# Altium footprint library OpenBMS.PcbLib: 26 footprints (part 1 of 2)
Each footprint in its own frame and in the unit in brackets; x right, y up, seen from the top. Pads: shape width x height; smd on the part's side, far side on the other; paste and mask are expansions set on the pad; w line width, h text height; cw(c..) or ccw(c..) is an arc to the next point about the centre after c.
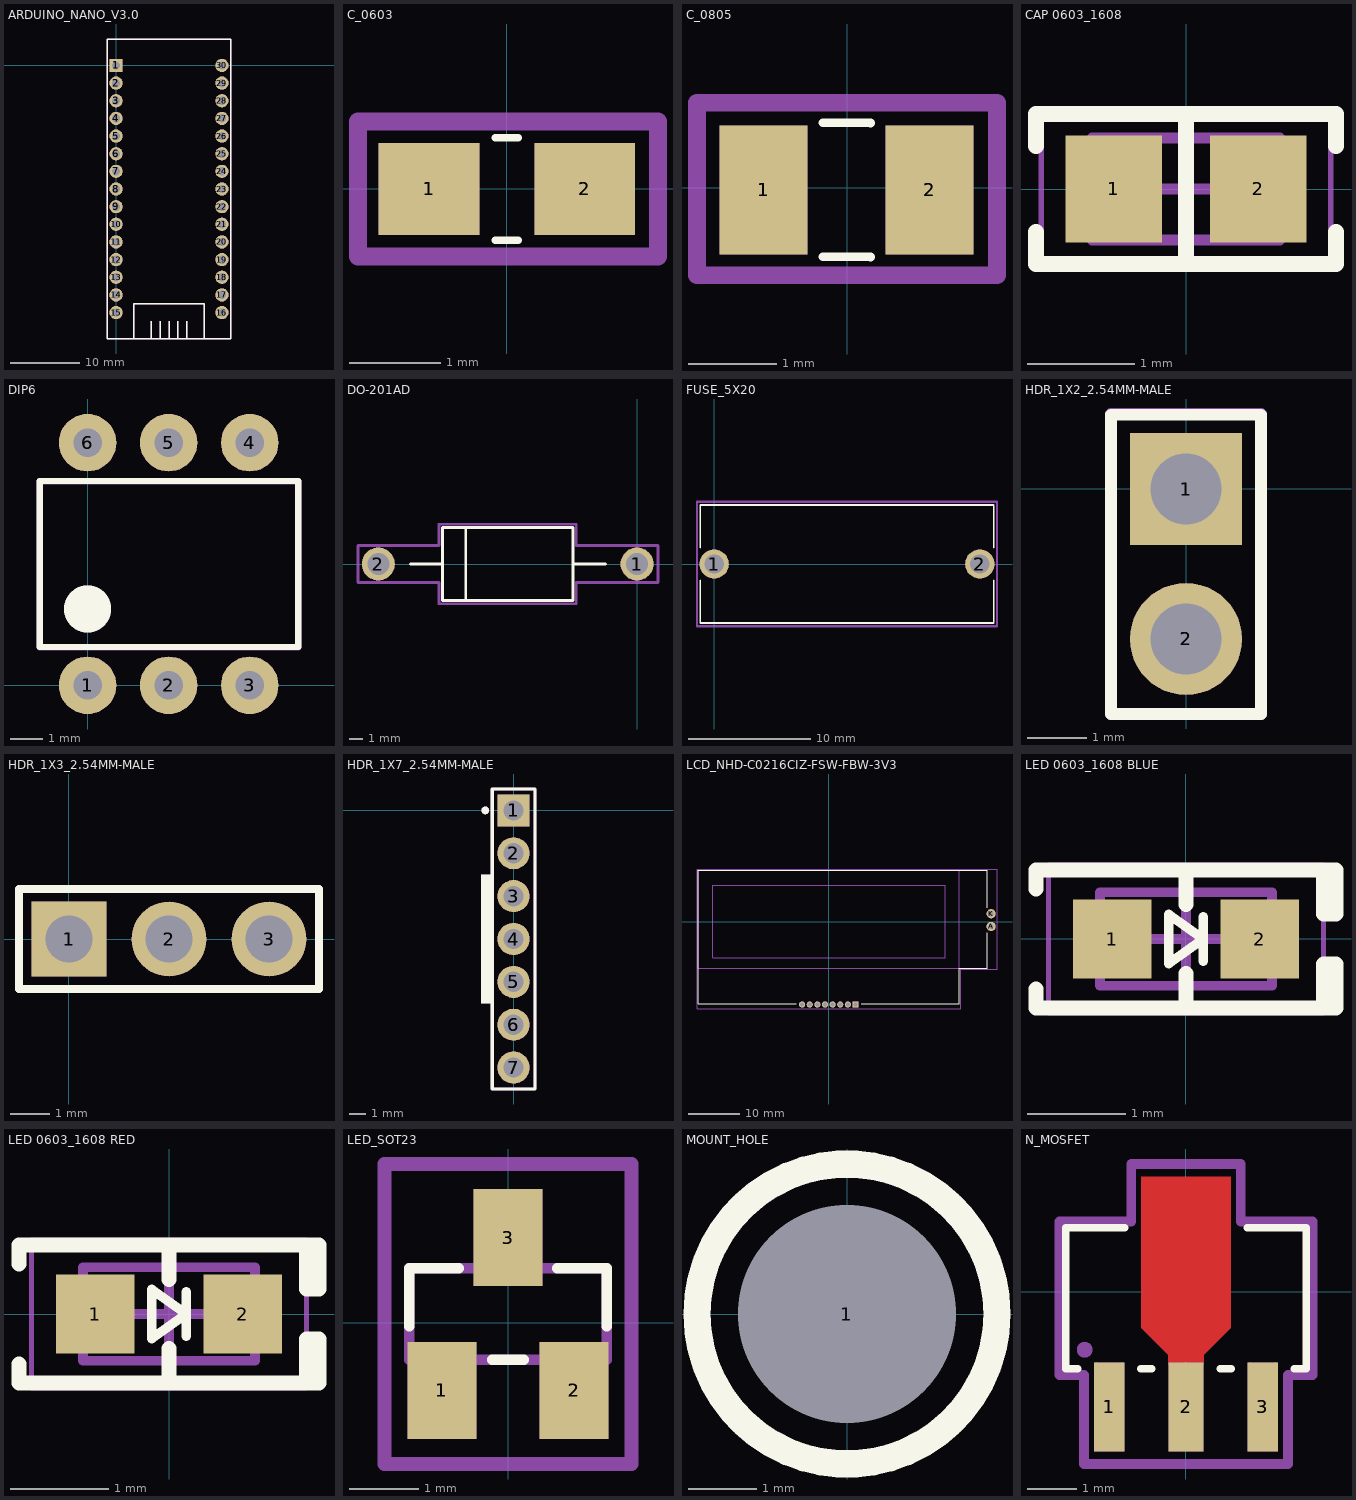
[diagram p0: the footprints below, top view; thin cyan lines are the x and y axes]

## ARDUINO_NANO_V3.0 [mm]
pads (60):
  rect 1.9x1.9 hole 1.2: 1(0,0)
  rect 1.9x1.9 on Mech15: 1(0,0)
  round 1.9 hole 1.2: 2(0,-2.54) 3(0,-5.08) 4(0,-7.62) 5(0,-10.16) 6(0,-12.7) 7(0,-15.24) 8(0,-17.78) 9(0,-20.32) 10(0,-22.86) 11(0,-25.4) 12(0,-27.94) 13(0,-30.48) 14(0,-33.02) 15(0,-35.56) 16(15.24,-35.56) 17(15.24,-33.02) 18(15.24,-30.48) 19(15.24,-27.94) 20(15.24,-25.4) 21(15.24,-22.86) 22(15.24,-20.32) 23(15.24,-17.78) 24(15.24,-15.24) 25(15.24,-12.7) 26(15.24,-10.16) 27(15.24,-7.62) 28(15.24,-5.08) 29(15.24,-2.54) 30(15.24,0)
  round 1.9 on Mech15: 2(0,-2.54) 3(0,-5.08) 4(0,-7.62) 5(0,-10.16) 6(0,-12.7) 7(0,-15.24) 8(0,-17.78) 9(0,-20.32) 10(0,-22.86) 11(0,-25.4) 12(0,-27.94) 13(0,-30.48) 14(0,-33.02) 15(0,-35.56) 16(15.24,-35.56) 17(15.24,-33.02) 18(15.24,-30.48) 19(15.24,-27.94) 20(15.24,-25.4) 21(15.24,-22.86) 22(15.24,-20.32) 23(15.24,-17.78) 24(15.24,-15.24) 25(15.24,-12.7) 26(15.24,-10.16) 27(15.24,-7.62) 28(15.24,-5.08) 29(15.24,-2.54) 30(15.24,0)
Top Overlay:
  lines w0.2: 5.08,-36.83 5.08,-39.37 ; 6.35,-36.83 6.35,-39.37 ; 7.62,-36.83 7.62,-39.37 ; 8.89,-36.83 8.89,-39.37 ; 10.16,-36.83 10.16,-39.37 ; 5.08,-39.37 -1.27,-39.37 -1.27,3.81 16.51,3.81 16.51,-39.37 12.7,-39.37 ; 5.08,-39.37 6.35,-39.37 ; 5.08,-39.37 6.35,-39.37 ; 5.08,-39.37 2.54,-39.37 2.54,-34.29 12.7,-34.29 12.7,-39.37 ; 6.35,-39.37 7.62,-39.37 ; 6.35,-39.37 7.62,-39.37 ; 7.62,-39.37 8.89,-39.37 ; 7.62,-39.37 8.89,-39.37 ; 8.89,-39.37 10.16,-39.37 ; 8.89,-39.37 10.16,-39.37 ; 10.16,-39.37 12.7,-39.37 ; 10.16,-39.37 12.7,-39.37
Mechanical 15:
  lines w0.2: 5.08,-36.83 5.08,-39.37 ; 6.35,-36.83 6.35,-39.37 ; 7.62,-36.83 7.62,-39.37 ; 8.89,-36.83 8.89,-39.37 ; 10.16,-36.83 10.16,-39.37 ; 5.08,-39.37 2.54,-39.37 2.54,-34.29 12.7,-34.29 12.7,-39.37 ; 5.08,-39.37 6.35,-39.37 ; 5.08,-39.37 6.35,-39.37 ; 6.35,-39.37 7.62,-39.37 ; 6.35,-39.37 7.62,-39.37 ; 7.62,-39.37 8.89,-39.37 ; 7.62,-39.37 8.89,-39.37 ; 8.89,-39.37 10.16,-39.37 ; 8.89,-39.37 10.16,-39.37 ; 10.16,-39.37 12.7,-39.37 ; 10.16,-39.37 12.7,-39.37 ; -1.27,-39.37 16.51,-39.37 16.51,3.81 -1.27,3.81 -1.27,-39.37
3D body "User Library-Nano-1.STEP": height 12.72, standoff -5.84, extent -1.275,-41.11 16.515,3.81

## C_0603 [mm]
pads (4):
  rect 1.1x1 smd: 1(-0.85,0) 2(0.85,0)
  rect 1.1x1 on Mech15: 1(-0.85,0) 2(0.85,0)
Top Overlay:
  lines w0.08: -0.127,-0.559 0.123,-0.559 ; -0.127,0.559 0.123,0.559
Mechanical 15:
  lines w0.2: -1.626,-0.737 -1.626,0.737 1.651,0.737 1.651,-0.737 -1.626,-0.737
3D body "GRT188R61H105KE13D.STEP": height 0.89, standoff -0.01, extent -0.8,-0.4 0.8,0.4

## C_0805 [mm]
pads (4):
  rect 1x1.47 smd: 1(-0.95,-0.025) 2(0.939,-0.025)
  rect 1x1.47 on Mech15: 1(-0.95,-0.025) 2(0.939,-0.025)
Top Overlay:
  lines w0.1: -0.275,-0.787 0.265,-0.79 ; -0.275,0.739 0.265,0.737
Mechanical 15:
  lines w0.2: -1.709,-0.998 1.707,-0.998 1.707,0.968 -1.709,0.968 -1.709,-0.998
3D body "GRM21BR71C105KA01K.STEP": height 1.44, standoff -0.01, extent -1.025,-0.65 0.975,0.6

## CAP 0603_1608 [mm] "Chip Capacitor, 2-Leads, Body 1.60x0.80mm, IPC Medium Density"
height 0.89
pads (2):
  rect 0.9x1 smd: 1(-0.675,0) 2(0.675,0)
Top Overlay:
  lines w0.15: -1.4,-0.4 -1.4,-0.7 1.4,-0.7 1.4,-0.4 ; -1.4,0.4 -1.4,0.7 1.4,0.7 1.4,0.4 ; 0,-0.7 0,0.7
Mechanical 13:
  lines w0.1: -0.875,-0.475 -0.875,0.475 0.875,0.475 0.875,-0.475 -0.875,-0.475
Mechanical 15:
  lines w0.05: -1.35,-0.75 -1.35,0.75 1.35,0.75 1.35,-0.75 -1.35,-0.75
  lines w0.1: -0.475,0 0.475,0 ; 0,-0.475 0,0.475
3D body "0603 cap.STEP": height 0.82, standoff 0, extent -0.8,-0.412 0.8,0.412

## DIP6 [mm]
pads (12):
  round 1.8 hole 0.9: 1(0,0) 2(2.54,0) 3(5.08,0) 4(5.08,7.6) 5(2.54,7.6) 6(0,7.6)
  round 1.8 on Mech15: 1(0,0) 2(2.54,0) 3(5.08,0) 4(5.08,7.6) 5(2.54,7.6) 6(0,7.6)
Top Overlay:
  circle w1.27: c0,2.393 r0.102
  lines w0.2: -1.5,1.2 -1.5,6.4 6.6,6.4 6.6,1.2 -1.5,1.2
Mechanical 15:
  circle w1.27: c0,2.388 r0.102
  lines w0.2: -1.5,1.195 6.6,1.195 6.6,6.395 -1.5,6.395 -1.5,1.195
3D body "User Library-DIP6.STEP": height 4.35, standoff -2.95, extent -1.016,-0.15 6.104,7.72

## DO-201AD [mm]
pads (4):
  round 2.4 hole 1.6: 1(0,0) 2(-18.84,0)
  round 2.4 on Mech15: 1(0,0) 2(-18.84,0)
Top Overlay:
  lines w0.2: -16.5,0 -14.22,0 ; -12.468,-2.65 -12.468,2.65 ; -4.62,0 -2.3,0 ; -14.17,-2.65 -4.67,-2.65 -4.67,2.65 -14.17,2.65 -14.17,-2.65
Mechanical 15:
  lines w0.127: -16.5,0 -14.22,0 ; -12.468,-2.65 -12.468,2.65 ; -4.62,0 -2.3,0 ; -14.17,-2.65 -14.17,2.65 -4.67,2.65 -4.67,-2.65 -14.17,-2.65
  lines w0.2: -20.32,-1.35 -20.32,1.35 -14.42,1.35 -14.42,2.9 -4.42,2.9 -4.42,1.35 1.524,1.35 1.524,-1.35 -4.42,-1.35 -4.42,-2.9 -14.42,-2.9 -14.42,-1.35 -20.32,-1.35
3D body "User Library-DO-201ADDO-27.step": height 5.63, standoff -3.99, extent -19.504,-2.82 0.636,2.82

## FUSE_5X20 [mm]
pads (4):
  round 2.4 hole 1.6: 1(0,0) 2(21.84,0)
  round 2.4 on Mech15: 1(0,0) 2(21.84,0)
Top Overlay:
  lines w0.127: -1.16,-1.32 -1.16,-4.85 23,-4.85 23,-1.32 ; -1.16,1.32 -1.16,4.85 23,4.85 23,1.32
Mechanical 15:
  lines w0.2: -1.41,-5.1 -1.41,5.1 23.25,5.1 23.25,-5.1 -1.41,-5.1
3D body "4527--3DModel-STEP-56544.STEP": height 10.81, standoff -4.15, extent -1.158,-4.851 22.998,4.851

## HDR_1X2_2.54MM-MALE [mm]
pads (4):
  rect 1.9x1.9 hole 1.2: 1(0,0)
  rect 1.9x1.9 on Mech15: 1(0,0)
  round 1.9 hole 1.2: 2(0,-2.54)
  round 1.9 on Mech15: 2(0,-2.54)
Top Overlay:
  lines w0.2: -1.27,-3.81 1.27,-3.81 1.27,1.257 -1.27,1.257 -1.27,-3.81
Mechanical 15:
  lines w0.2: -1.27,-3.81 1.27,-3.81 1.27,1.27 -1.27,1.27 -1.27,-3.81
3D body "pin_header_aw140-eg-g02a.stp": height 8.63, standoff -3.77, extent -1.253,-3.71 1.246,1.37

## HDR_1X3_2.54MM-MALE [mm] "Connector; Header; 3 Position"
pads (6):
  rect 1.9x1.9 hole 1.2: 1(0,0)
  rect 1.9x1.9 on Mech15: 1(0,0)
  round 1.9 hole 1.2: 2(2.54,0) 3(5.08,0)
  round 1.9 on Mech15: 2(2.54,0) 3(5.08,0)
Top Overlay:
  lines w0.2: -1.27,-1.27 -1.27,1.27 6.35,1.27 6.35,-1.27 -1.27,-1.27
Mechanical 15:
  lines w0.2: -1.27,-1.27 6.35,-1.27 6.35,1.27 -1.27,1.27 -1.27,-1.27
3D body "User Library-1x3 TH Pitch 2_54mm.STEP": height 9.21, standoff -3.49, extent -1.27,-1.27 6.35,1.27

## HDR_1X7_2.54MM-MALE [mm]
pads (14):
  rect 1.9x1.9 hole 1.2: 1(0,0)
  rect 1.9x1.9 on Mech15: 1(0,0)
  round 1.9 hole 1.2: 2(0,-2.54) 3(0,-5.08) 4(0,-7.62) 5(0,-10.16) 6(0,-12.7) 7(0,-15.24)
  round 1.9 on Mech15: 2(0,-2.54) 3(0,-5.08) 4(0,-7.62) 5(0,-10.16) 6(0,-12.7) 7(0,-15.24)
Top Overlay:
  circle w0.254: c-1.676,0 r0.1
  rectangle: -1.93,-11.43 -1.194,-3.81
  lines w0.2: -1.27,-16.51 1.27,-16.51 1.27,1.27 -1.27,1.27 -1.27,-16.51
Mechanical 15:
  circle w0.254: c-1.676,0 r0.1
  rectangle: -1.93,-11.43 -1.194,-3.81
  lines w0.2: -1.27,-16.51 -1.27,1.27 1.27,1.27 1.27,-16.51 -1.27,-16.51
3D body "705430041.stp": height 11.82, standoff -3.29, extent -4.064,-17.78 2.54,2.54

## LCD_NHD-C0216CIZ-FSW-FBW-3V3 [mm]
pads (20):
  rect 1.2x1.2 hole 0.8: 1(5.25,-16.3)
  rect 1.2x1.2 on Mech15: 1(5.25,-16.3)
  round 1.2 hole 0.8: 2(3.75,-16.3) 3(2.25,-16.3) 4(0.75,-16.3) 5(-0.75,-16.3) 6(-2.25,-16.3) 7(-3.75,-16.3) 8(-5.25,-16.3)
  round 1.2 on Mech15: 2(3.75,-16.3) 3(2.25,-16.3) 4(0.75,-16.3) 5(-0.75,-16.3) 6(-2.25,-16.3) 7(-3.75,-16.3) 8(-5.25,-16.3)
  round 1.8 hole 1: A(31.9,-0.96) K(31.9,1.54)
  round 1.8 on Mech15: A(31.9,-0.96) K(31.9,1.54)
Top Overlay:
  lines w0.127: -6.35,-16.15 -25.65,-16.15 -25.65,10.05 31.15,10.05 31.15,2.7 ; 6.35,-16.15 25.65,-16.15 25.65,-9.15 31.15,-9.15 31.15,-2.2
Mechanical 15:
  lines w0.127: -25.65,-9.15 25.65,-9.15 25.65,10.05 -25.65,10.05 -25.65,-9.15 ; -22.85,-7.15 22.85,-7.15 22.85,7.15 -22.85,7.15 -22.85,-7.15
  lines w0.2: -25.9,-17.15 25.9,-17.15 25.9,-9.4 33.05,-9.4 33.05,10.3 -25.9,10.3 -25.9,-17.15
3D body "NHD-C0216CIZ-FSW-FBW-3V3--3DModel-STEP-56544.STEP": height 6, standoff -4.4, extent -25.618,-16.467 32.182,10.033

## LED 0603_1608 BLUE [mm] "Chip Diode, 2-Leads, Body 1.60x0.80mm, IPC Medium Density"
height 0.45
pads (2):
  rect 0.8x0.8 smd: 1(-0.75,0) 2(0.75,0)
Top Overlay:
  lines w0.1: 0.175,-0.225 0.175,0 ; 0.175,0.225 0.175,0 ; 0.175,0 -0.175,0.25 -0.175,0 -0.175,-0.25 0.175,0
  lines w0.15: -1.524,-0.508 -1.524,-0.7 1.5,-0.7 ; -1.524,0.508 -1.524,0.7 1.5,0.7 ; 0,-0.7 0,-0.35 ; 0,0.35 0,0.7 ; 1.397,-0.7 1.524,-0.7 1.524,-0.254 1.397,-0.254 1.397,-0.7 ; 1.397,0.254 1.524,0.254 1.524,0.7 1.397,0.7 1.397,0.254
Mechanical 13:
  lines w0.1: -0.875,-0.475 -0.875,0.475 0.875,0.475 0.875,-0.475 -0.875,-0.475
Mechanical 15:
  lines w0.05: -1.397,-0.75 -1.397,0.75 1.397,0.75 1.397,-0.75 -1.397,-0.75
  lines w0.1: -0.475,0 0.475,0 ; 0,-0.475 0,0.475
3D body "LED 0603 Lens BLUE.STEP": height 0.53, standoff 0.18, extent -0.55,-0.4 0.55,0.4
3D body "LED 0603 Base BLUE.STEP": height 0.28, standoff 0, extent -0.8,-0.4 0.8,0.4

## LED 0603_1608 RED [mm] "Chip Diode, 2-Leads, Body 1.60x0.80mm, IPC Medium Density"
height 0.45
pads (2):
  rect 0.8x0.8 smd: 1(-0.75,0) 2(0.75,0)
Top Overlay:
  lines w0.1: 0.175,-0.225 0.175,0 ; 0.175,0.225 0.175,0 ; 0.175,0 -0.175,-0.25 -0.175,0 -0.175,0.25 0.175,0
  lines w0.15: -1.524,-0.508 -1.524,-0.7 1.5,-0.7 ; -1.524,0.508 -1.524,0.7 1.5,0.7 ; 0,-0.7 0,-0.35 ; 0,0.35 0,0.7 ; 1.397,-0.7 1.397,-0.254 1.524,-0.254 1.524,-0.7 1.397,-0.7 ; 1.397,0.254 1.397,0.7 1.524,0.7 1.524,0.254 1.397,0.254
Mechanical 13:
  lines w0.1: -0.875,-0.475 0.875,-0.475 0.875,0.475 -0.875,0.475 -0.875,-0.475
Mechanical 15:
  lines w0.05: -1.397,-0.75 1.397,-0.75 1.397,0.75 -1.397,0.75 -1.397,-0.75
  lines w0.1: -0.475,0 0.475,0 ; 0,-0.475 0,0.475
3D body "LED 0603 Base RED.STEP": height 0.28, standoff 0, extent -0.8,-0.4 0.8,0.4
3D body "LED 0603 Lens RED.STEP": height 0.53, standoff 0.18, extent -0.55,-0.4 0.55,0.4

## LED_SOT23 [mm]
pads (6):
  rect 1x1.4 smd: 1(-0.95,-0.973) 2(0.95,-0.973) 3(0,1.227)
  rect 1x1.4 on Mech15: 1(-0.95,-0.973) 2(0.95,-0.973) 3(0,1.227)
Top Overlay:
  lines w0.152: -1.422,-0.051 -1.422,0.787 -0.711,0.787 ; -0.229,-0.533 0.229,-0.533 ; 0.711,0.787 1.422,0.787 1.422,-0.051
Mechanical 4:
  region: -0.229,1.422 0.229,1.422 0.229,0.838 -0.229,0.838
  region: 0.711,-0.584 1.168,-0.584 1.168,-1.169 0.711,-1.169
  region: -1.17,-0.584 -0.711,-0.584 -0.711,-1.17 -1.17,-1.17
  region: -0.229,1.422 0.229,1.422 0.229,0.838 -0.229,0.838
  region: 0.711,-0.584 1.168,-0.584 1.168,-1.169 0.711,-1.169
  region: -1.17,-0.584 -0.711,-0.584 -0.711,-1.17 -1.17,-1.17
  lines w0.152: -1.422,-0.533 1.422,-0.533 ; -1.422,-0.533 -1.422,0.787 ; -1.422,-0.533 1.422,-0.533 ; -1.422,-0.533 -1.422,0.787 ; -1.422,0.787 1.422,0.787 ; -1.422,0.787 1.422,0.787 ; 1.422,-0.533 1.422,0.787 ; 1.422,-0.533 1.422,0.787
Mechanical 15:
  lines w0.152: -1.422,-0.051 -1.422,0.787 -0.711,0.787 ; -0.229,-0.533 0.229,-0.533 ; 0.711,0.787 1.422,0.787 1.422,-0.051
  lines w0.2: -1.778,-2.032 -1.778,2.286 1.778,2.286 1.778,-2.032 -1.778,-2.032
3D body "LED SOT23 RED v2.stp": height 1.05, standoff 0, extent -1.5,-1.083 1.5,1.333

## MOUNT_HOLE [mm] "Mounting Hole M2"
pads (1):
  round 2 hole 3.2 unplated mask+0.025: 1(0,0)
Top Overlay:
  circle w0.4: c0,0 r2.2

## N_MOSFET [mm]
pads (6):
  rect 0.608x1.799 smd paste+0 mask+0: 1(-1.55,-2.322) 3(1.55,-2.322)
  rect 0.608x1.799 on Mech15 paste+0 mask+0: 1(-1.55,-2.322) 3(1.55,-2.322)
  rect 0.71x1.799 smd paste+0 mask+0: 2(0,-2.322)
  rect 0.71x1.799 on Mech15 paste+0 mask+0: 2(0,-2.322)
Top Layer:
  region: 0.355,-1.422 -0.355,-1.422 -0.355,-1.269 -0.901,-0.723 -0.901,2.328 0.901,2.328 0.901,-0.723 0.355,-1.269
Top Overlay:
  lines w0.152: -2.187,-1.549 -2.426,-1.549 -2.426,1.295 -1.234,1.295 ; -0.913,-1.549 -0.688,-1.549 ; 0.688,-1.549 0.913,-1.549 ; 1.234,1.295 2.426,1.295 2.426,-1.549 2.187,-1.549
Top Paste:
  region: 0.355,-1.472 -0.355,-1.472 -0.355,-1.269 -0.901,-0.723 -0.901,2.078 0.901,2.078 0.901,-0.723 0.355,-1.269
Top Solder:
  region: 0.355,-1.472 -0.355,-1.472 -0.355,-1.269 -0.901,-0.723 -0.901,2.078 0.901,2.078 0.901,-0.723 0.355,-1.269
Mechanical 13:
  lines w0.025: -1.804,-1.422 -1.804,-2.921 -1.296,-2.921 -1.296,-1.422 ; -0.305,-1.422 -0.305,-2.921 0.305,-2.921 0.305,-1.422 ; 1.296,-1.422 1.296,-2.921 1.804,-2.921 1.804,-1.422
Mechanical 15:
  circle w0.192: c-2.045,-1.168 r0.064
  region: 0.355,-1.472 -0.355,-1.472 -0.355,-1.269 -0.901,-0.723 -0.901,2.078 0.901,2.078 0.901,-0.723 0.355,-1.269
  lines w0.2: -2.553,-1.676 -2.553,1.422 -1.105,1.422 -1.105,2.582 1.105,2.582 1.105,1.422 2.553,1.422 2.553,-1.676 2.058,-1.676 2.058,-3.475 -2.058,-3.475 -2.058,-1.676 -2.553,-1.676
3D body "LND150N8-G--3DModel-STEP-56544.STEP": height 1.61, standoff 0.01, extent -2.25,-2.395 2.25,1.7